# Altium footprint library Cty1.PcbLib: 869 footprints (part 17 of 55)
Each footprint in its own frame and in the unit in brackets; x right, y up, seen from the top. Pads: shape width x height; smd on the part's side, far side on the other; paste and mask are expansions set on the pad; w line width, h text height; cw(c..) or ccw(c..) is an arc to the next point about the centre after c.
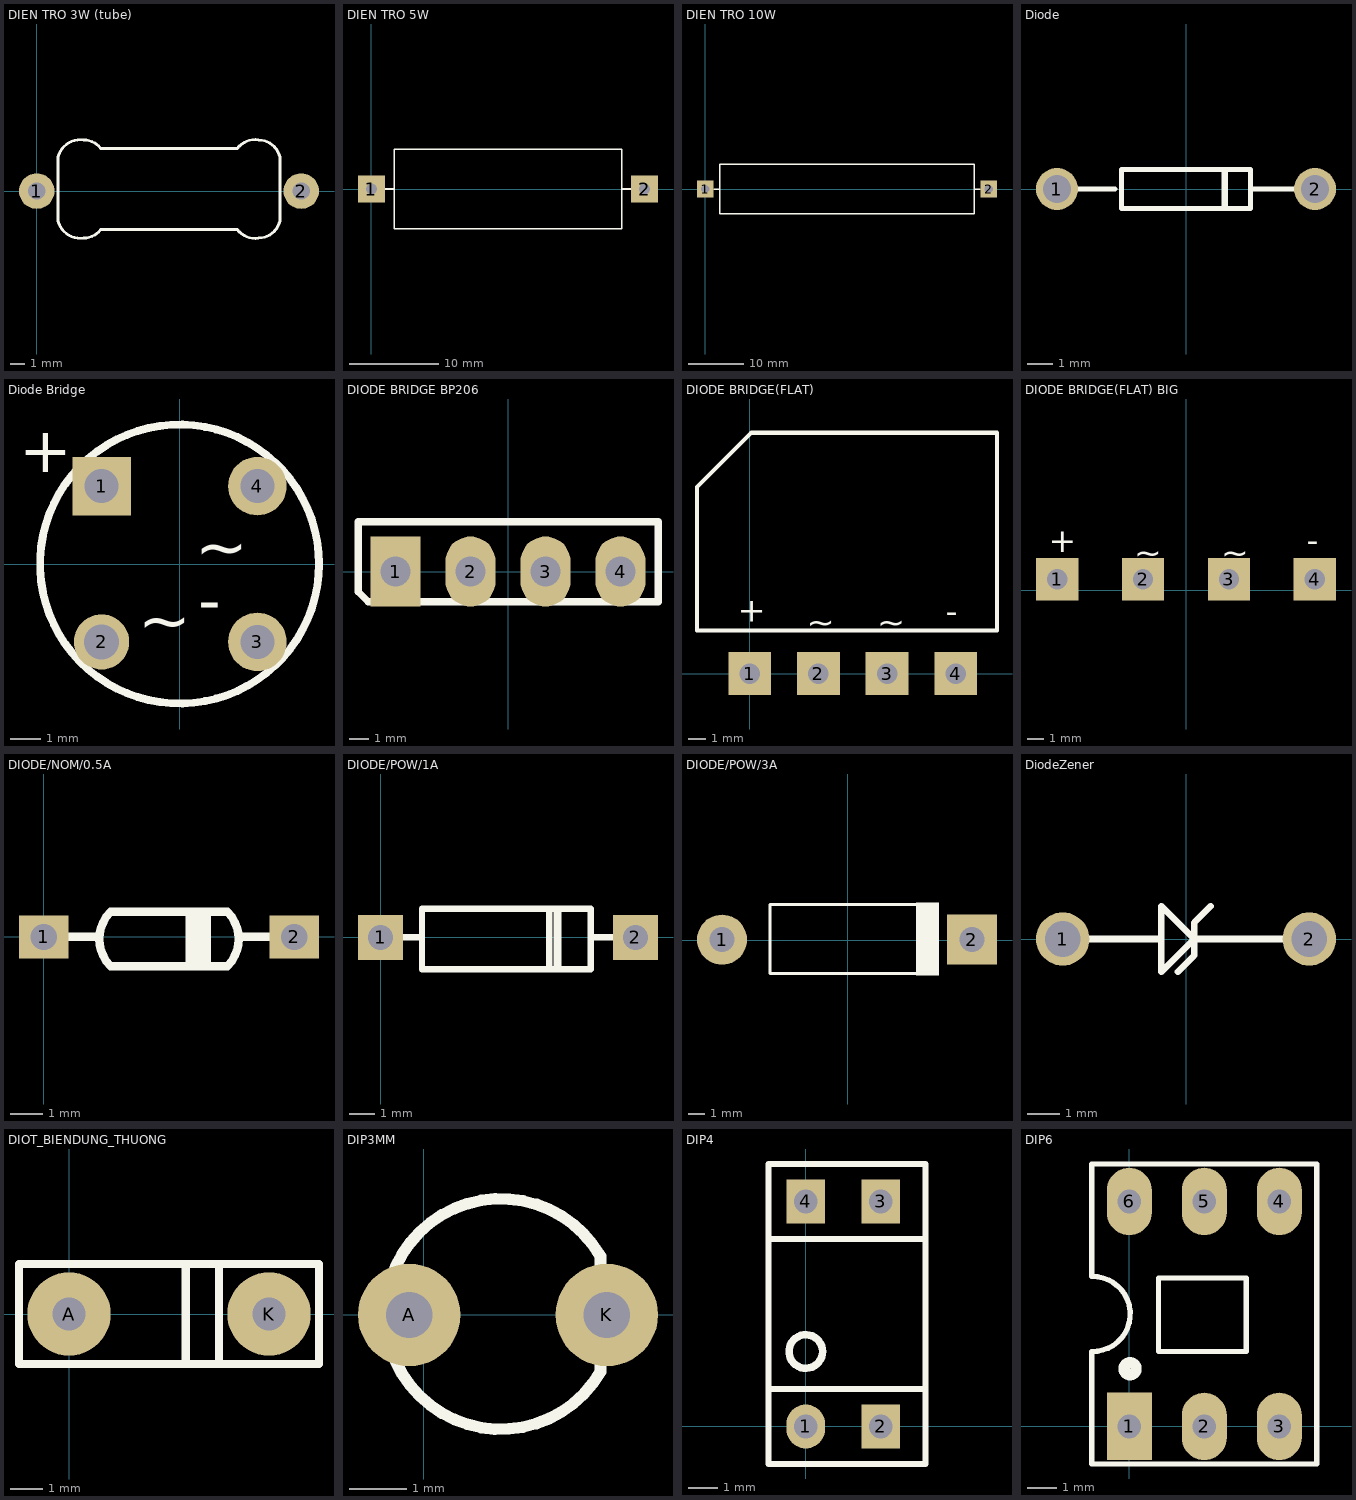
[diagram p16: the footprints below, top view; thin cyan lines are the x and y axes]

## DIEN TRO 3W (tube) [mm] "Dien tro 3W dang ong tru"
pads (2):
  round 2.5 hole 1.2: 1(0,0) 2(18.609,0)
Top Overlay:
  lines w0.2: 3.302,-3.302 cw(c3.062,-1.711) 1.501,-2.101 1.501,2.401 cw(c3.062,2.011) 3.302,3.602 cw(c3.302,2.101) 4.502,3.002 14.107,3.001 cw(c15.357,2.051) 15.607,3.602 cw(c15.586,2.037) 17.108,2.401 17.108,-2.101 cw(c15.586,-1.737) 15.607,-3.302 cw(c15.357,-1.751) 14.107,-2.701 4.502,-2.701 cw(c3.302,-1.801) 3.302,-3.301

## DIEN TRO 5W [mm]
pads (2):
  rect 3x3 hole 1.2: 1(0,0) 2(30.48,0)
Top Overlay:
  lines w0.203: 2.54,-4.445 2.54,4.445 ; 2.54,-4.445 27.94,-4.445 ; 2.54,-4.445 2.54,4.445 ; 2.54,-4.445 27.94,-4.445 ; 2.54,4.445 27.94,4.445 ; 2.54,4.445 27.94,4.445 ; 27.94,-4.445 27.94,4.445 ; 27.94,-4.445 27.94,4.445 ; 1.27,0 2.54,0 1.27,0 ; 27.94,0 29.21,0 27.94,0
3D body: height 7.62, standoff 0, extent 2.54,-4.445 27.94,4.445

## DIEN TRO 10W [mm]
pads (2):
  rect 3x3 hole 1.5: 1(0,0) 2(50.8,0)
Top Overlay:
  lines w0.254: 1.524,0 2.54,0 ; 48.26,0 49.276,0 ; 2.54,-4.445 48.26,-4.445 48.26,4.445 2.54,4.445 2.54,-4.445
3D body: height 7.62, standoff 0, extent 2.54,-4.445 48.26,4.445

## Diode [mil] "Diode"
pads (2):
  round 65 hole 43.31: 1(-200,0) 2(200,0)
Top Overlay:
  lines w7.87: -170,0 -110,0 ; 100,0 200,0 ; -100,-30 100,-30 100,30 -100,30 -100,-30
  lines w10: 60,-27 60,27

## Diode Bridge [mm] "Bridge Rectifier; 4 Terminals; Body 9.4 x 9.4 mm (typ); Pitch 5.08 mm"
height 0.14
pads (4):
  rect 1.905x1.905 hole 1.1: 1(-2.54,2.54)
  round 1.8 hole 1.143: 2(-2.54,-2.54)
  round 1.905 hole 1.1: 3(2.54,-2.54) 4(2.54,2.54)
Top Overlay:
  circle w0.254: c0,0 r4.547
  text "+" at -5.232,2.997 h1.5
  text "-" at 0.61,-1.905 h1.5
  text "~" at -1.346,-2.565 h1.5
  text "~" at 0.508,-0.178 h1.5

## DIODE BRIDGE BP206 [mil] "DIP; 4 Leads; Row Spacing 7.62 mm; Pitch 2.54 mm"
height 209.84
pads (4):
  rect 100x140 hole 60: 1(-225,0)
  oval 100x140 hole 60: 2(-75,0) 3(75,0) 4(225,0)
Top Overlay:
  lines w15: -300,-40 -300,100 300,100 300,-60 -280,-60 -300,-40

## DIODE BRIDGE(FLAT) [mm]
pads (4):
  rect 2.5x2.5 / inner round 1.575 / far side rect 2.5x2.5 hole 1.2: 1(0,0) 2(4,0) 3(8,0) 4(12,0)
Top Overlay:
  lines w0.254: -3.073,2.515 -3.073,10.871 0.076,14.021 14.402,14.021 14.402,2.515 2.045,2.515 -3.073,2.515
  text "-" at 11.405,2.946 h1.43
  text "+" at -0.686,3.01 h1.43
  text "~" at 7.417,2.299 h1.43
  text "~" at 3.327,2.286 h1.43

## DIODE BRIDGE(FLAT) BIG [mil]
pads (4):
  rect 98.43x98.43 hole 47.24: 1(-300,26) 2(-100,26) 3(100,26) 4(300,26)
Top Overlay:
  text "-" at 281,90 h56.25
  text "+" at -319,89 h56.25
  text "~" at 82,61 h56.25
  text "~" at -121,61 h56.25
3D body "User Library-bridge 2.step": height 955.65, standoff -486.64, extent -438.97,-70.08 438.98,77.95

## DIODE/NOM/0.5A [mm]
pads (2):
  rect 1.5x1.3 hole 0.8: 1(0,0) 2(7.62,0)
Top Overlay:
  lines w0.254: 0.635,0 1.651,0 ; 4.445,-0.762 4.445,0.762 ; 4.699,-0.889 4.699,0.762 ; 4.953,-0.889 4.953,0.762 ; 5.969,0 7.112,0 ; 2.032,-0.889 cw(c2.857,-0.064) 2.032,0.762 5.588,0.762 cw(c4.763,-0.064) 5.588,-0.889 2.032,-0.889

## DIODE/POW/1A [mm]
pads (2):
  rect 1.8x1.8 hole 1: 1(0,0) 2(10.16,0)
Top Overlay:
  lines w0.2: 6.985,-1.27 6.985,1.143 ; 7.112,-1.27 7.112,1.143
  lines w0.254: 0.635,0 1.651,0 ; 6.731,-1.27 6.731,1.143 ; 8.382,0 9.525,0 ; 1.651,-1.27 8.382,-1.27 8.382,1.143 1.651,1.143 1.651,-1.27
3D body "SW3DPS-DIODE0_4.step": height 2.55, standoff -2.54, extent -0.381,-1.283 10.541,1.283

## DIODE/POW/3A [mil]
pads (2):
  round 120 hole 60: 1(-301,1)
  rect 120x120 hole 60: 2(298,1)
Top Overlay:
  rectangle: 164,-85 219,90
  lines w7.87: 214,-65 199,-80 -186,-80 -186,85 194,85 214,65
3D body "User Library-BYW98.step": height 248.03, standoff -92.52, extent -320.86,-104.33 320.87,104.33

## DiodeZener [mil] "DiodeZener"
pads (2):
  round 65 hole 43.31: 1(-150,0) 2(150,0)
Top Overlay:
  lines w8: -120,0 -30,0 ; -10,-40 10,-20 10,0 ; 30,40 10,20 10,0 ; 120,0 10,0 ; 10,0 -30,40 -30,-40 10,0

## DIOT_BIENDUNG_THUONG [mm]
pads (2):
  round 2.54 hole 1: A(0,0) K(6.096,0)
Top Overlay:
  lines w0.254: 3.556,-1.524 3.556,1.524 ; 4.572,-1.524 4.572,1.524 ; -1.524,-1.524 -1.524,1.524 7.62,1.524 7.62,-1.524 -1.524,-1.524

## DIP3MM [mil]
pads (2):
  round 70 hole 31.5 unplated: A(-10,0) K(125,0)
Top Overlay:
  lines w7.87: 120.66,-38.84 cw(c52.55,0.68) 120.69,40.14
  lines w8: 120.66,-38.84 120.66,-29.13 ; 120.69,29.13 120.69,40.14

## DIP4 [mm] "W.300/L.400"
height 5.59
pads (4):
  oval 1.3x1.5 hole 0.8: 1(0,0)
  rect 1.3x1.5 hole 0.8: 2(2.54,0) 3(2.54,7.62) 4(0,7.62)
Top Overlay:
  circle w0.254: c0,2.54 r0.568
  lines w0.203: -1.27,1.27 4.064,1.27 ; -1.27,1.27 -1.27,6.35 ; -1.27,1.27 4.064,1.27 ; -1.27,1.27 -1.27,6.35 ; -1.27,1.27 -1.27,-1.27 4.064,-1.27 4.064,1.524 4.064,6.35 ; -1.27,1.27 -1.27,2.54 -1.27,5.08 -1.27,8.89 4.064,8.89 4.064,6.35 ; -1.27,6.35 4.064,6.35 ; -1.27,6.35 4.064,6.35 ; 4.064,1.27 4.064,6.35
3D body: height 5, standoff 0.4, extent -1.27,-1.27 4.064,8.89

## DIP6 [mil] "6 PIN, W 300mil, Pin to pin 100mil"
height 100
pads (6):
  rect 60x90 hole 31.5: 1(0,0)
  oval 60x90 hole 31.5: 2(100,0) 3(200,0) 4(200,300) 5(100,300) 6(0,300)
Top Overlay:
  circle w15: c1,77 r8
  lines w7: -50.38,100.05 ccw(c-48.69,150.02) -50,200 ; -50,100 -50,-50 250,-50 250,350 -50,350 -50,201 ; 39,100 156,100 156,198 39,198 39,100
3D body "SW3DPS-DIP6-DEFAULT.STEP": height 169.69, standoff -129.13, extent -58.11,-7.48 260,307.48